# Altium footprint library Tracker_v1_1_pcb.PcbLib: 32 footprints (part 2 of 2)
Each footprint in its own frame and in the unit in brackets; x right, y up, seen from the top. Pads: shape width x height; smd on the part's side, far side on the other; paste and mask are expansions set on the pad; w line width, h text height; cw(c..) or ccw(c..) is an arc to the next point about the centre after c.
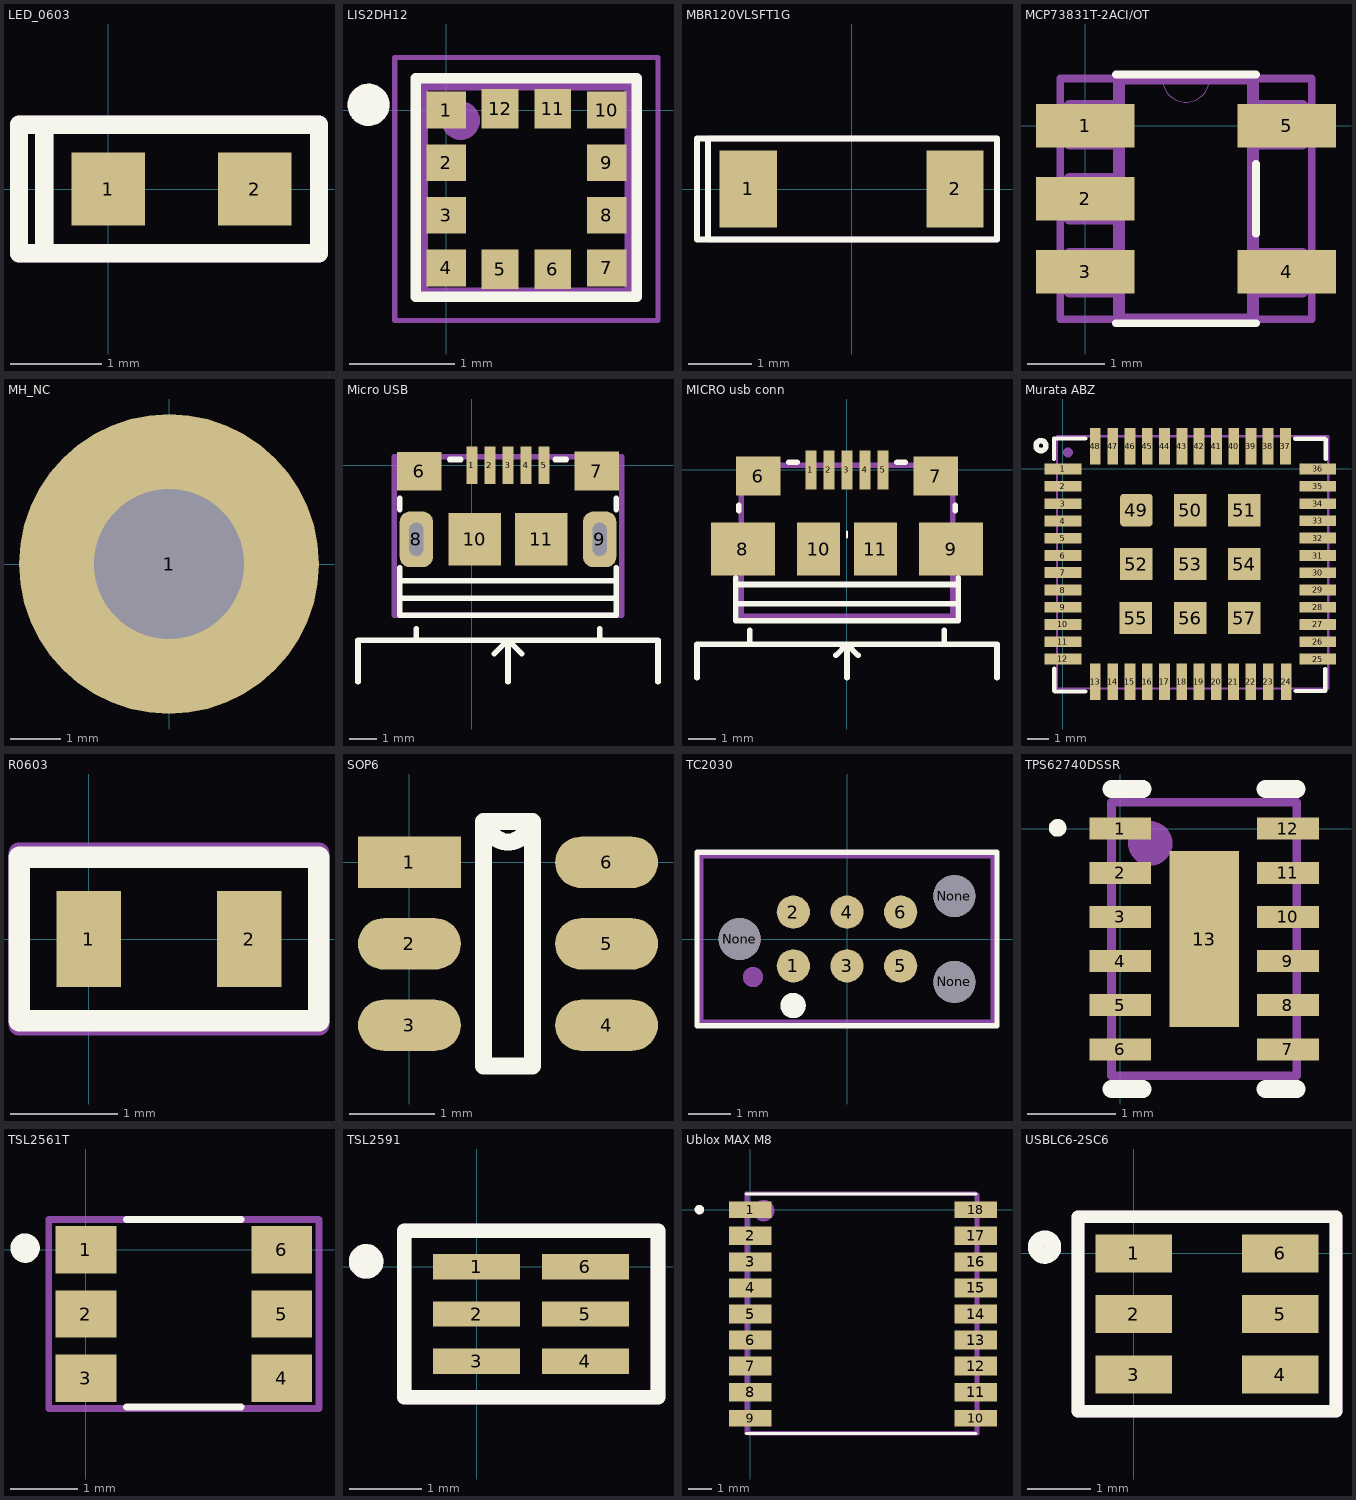
[diagram p1: the footprints below, top view; thin cyan lines are the x and y axes]

## LED_0603 [mm]
pads (2):
  rect 0.8x0.8 smd: 1(0,0) 2(1.6,0)
Top Overlay:
  lines w0.2: -0.7,-0.7 -0.975,-0.7 -0.975,0.7 -0.7,0.7 ; -0.7,-0.7 -0.7,0.7 ; -0.7,-0.7 2.3,-0.7 2.3,0.7 -0.7,0.7
Mechanical 29:
  lines w0.2: -0.7,-0.7 -0.7,0.7 ; -0.975,-0.7 -0.975,0.7 2.3,0.7 2.3,-0.7 -0.975,-0.7
  text "'.Designator'" at -0.4,-0.1 h0.6
3D body "User Library-LED SMD 0603 super red.step": height 0.6, standoff -0.05, extent 0,-0.4 1.7,0.4
3D body: height 0.65, standoff 0, extent 0.8,0.2 0.8,0.2
3D body: height 0.61, standoff 0, extent 0.451,-0.2 1.251,0.2

## LIS2DH12 [mm]
pads (12):
  rect 0.375x0.35 smd: 1(0,0) 2(0,-0.5) 3(0,-1) 4(0,-1.5) 7(1.525,-1.5) 8(1.525,-1) 9(1.525,-0.5) 10(1.525,0)
  rect 0.35x0.375 smd: 5(0.513,-1.513) 6(1.012,-1.513) 11(1.012,0.012) 12(0.513,0.012)
Top Overlay:
  circle w0.2: c-0.737,0.05 r0.1
  lines w0.1: -0.288,-1.775 1.813,-1.775 1.813,0.3 -0.288,0.3 -0.288,-1.775
Mechanical 4:
  circle w0.2: c-0.737,0.05 r0.1
  circle w0.2: c-0.737,0.05 r0.1
  lines w0.127: -0.238,-1.75 1.763,-1.75 ; -0.238,-1.75 -0.238,0.25 ; -0.238,-1.75 1.763,-1.75 ; -0.238,-1.75 -0.238,0.25 ; -0.238,0.25 1.763,0.25 ; -0.238,0.25 1.763,0.25 ; 1.763,-1.75 1.763,0.25 ; 1.763,-1.75 1.763,0.25
Mechanical 16:
  lines w0.05: -0.487,-2 2.013,-2 2.013,0.5 -0.487,0.5 -0.487,-2
Mechanical 29:
  circle w0.254: c0.138,-0.1 r0.056
  lines w0.1: -0.253,-1.766 1.746,-1.766 1.746,0.234 -0.253,0.234 -0.253,-1.766
  text "'.Designator'" at -0.162,-1.05 h0.6
3D body "User Library-LIS2DW12.STEP": height 0.63, standoff -0.08, extent -0.253,-1.766 1.746,0.234

## MBR120VLSFT1G [mm]
pads (2):
  rect 0.91x1.22 smd: 1(-1.635,0) 2(1.635,0)
Top Overlay:
  lines w0.1: -2.25,0.8 -2.45,0.8 -2.45,-0.8 -2.275,-0.8 ; -2.275,-0.8 2.3,-0.8 2.3,0.8 -2.275,0.8 -2.275,-0.8
Mechanical 29:
  circle w0.254: c-1.65,0 r0.125
  lines w0.1: -2.275,-0.8 2.3,-0.8 2.3,0.8 -2.275,0.8 -2.275,-0.8
  text "'.Designator'" at -1.075,-0.225 h0.6
3D body "User Library-SOD323.step": height 0.9, standoff -0.09, extent -1.25,-0.65 1.25,0.6
3D body: height 1, standoff 0, extent -1.35,-0.825 1.35,0.825

## MCP73831T-2ACI/OT [mil]
pads (5):
  rect 50x22 smd: 1(0,0) 2(0,-37) 3(0,-74) 4(102,-74) 5(102,0)
Top Overlay:
  circle w10: c0,0 r4.4
  lines w3.94: 15.57,-99.99 86.43,-99.99 ; 15.57,25.99 86.43,25.99 ; 86.43,-54.72 86.43,-19.28
Mechanical 4:
  lines w0: 39,24 ccw(c51,24) 63,24 cw(c51,24) 39,24
  lines w6: -8,-84 -8,-65 ; -8,-84 17,-84 ; -8,-84 -8,-65 ; -8,-84 17,-84 ; -8,-65 17,-65 ; -8,-65 17,-65 ; -8,-47 -8,-27 ; -8,-47 17,-47 ; -8,-47 -8,-27 ; -8,-47 17,-47 ; -8,-27 17,-27 ; -8,-27 17,-27 ; -8,-9 -8,10 ; -8,-9 17,-9 ; -8,-9 -8,10 ; -8,-9 17,-9 ; -8,10 17,10 ; -8,10 17,10 ; 17,-98 85,-98 ; 17,-98 17,-84 ; 17,-98 85,-98 ; 17,-98 17,-84 ; 17,-84 17,-65 ; 17,-84 17,-65 ; 17,-65 17,-47 ; 17,-65 17,-47 ; 17,-47 17,-27 ; 17,-47 17,-27 ; 17,-27 17,-9 ; 17,-27 17,-9 ; 17,-9 17,10 ; 17,-9 17,10 ; 17,10 17,24 ; 17,10 17,24 ; 17,24 39,24 ; 17,24 39,24 ; 39,24 63,24 ; 39,24 63,24 ; 63,24 85,24 ; 63,24 85,24 ; 85,-98 85,-84 ; 85,-98 85,-84 ; 85,-84 85,-65 ; 85,-84 110,-84 ; 85,-84 85,-65 ; 85,-84 110,-84 ; 85,-65 85,-9 ; 85,-65 110,-65 ; 85,-65 85,-9 ; 85,-65 110,-65 ; 85,-9 85,10 ; 85,-9 110,-9 ; 85,-9 85,10 ; 85,-9 110,-9 ; 85,10 85,24 ; 85,10 110,10 ; 85,10 85,24 ; 85,10 110,10 ; 110,-84 110,-65 ; 110,-84 110,-65 ; 110,-9 110,10 ; 110,-9 110,10
Mechanical 29:
  circle w10: c0,0 r2.2
  lines w3.94: -12.7,-98.02 -12.7,24.02 114.7,24.02 114.7,-98.02 -12.7,-98.02
3D body "PZ_MCP73831.stp": height 54, standoff -3.09, extent -12.7,-98.02 114.7,24.02

## MH_NC [mm]
pads (1):
  round 6 hole 3 unplated: 1(0,0)

## Micro USB [mm]
pads (11):
  rect 0.4x1.35 smd mask+0.05: 1(0,0) 2(0.65,0) 3(1.3,0) 4(1.95,0) 5(2.6,0)
  rect 1.6x1.4 smd: 6(-1.9,-0.225) 7(4.5,-0.22)
  rrect60% 1.2x2 hole 0.5 slot 1.2 at 90 deg mask+0.05: 8(-2,-2.675) 9(4.6,-2.675)
  rect 1.9x1.9 smd: 10(0.1,-2.675) 11(2.5,-2.675)
Top Overlay:
  lines w0.2: -4.1,-7.8 -4.1,-6.3 6.7,-6.3 6.7,-7.8 ; -2.6,-4.8 5.2,-4.8 ; -2.6,-4.166 5.2,-4.166 ; -2.6,-3.7 -2.6,-5.4 5.2,-5.4 5.2,-3.7 ; -2.6,-1.6 -2.6,-1.2 ; -2,-6.3 -2,-5.9 ; -0.8,0.2 -0.4,0.2 ; 0.8,-6.8 1.3,-6.3 ; 1.3,-7.8 1.3,-6.3 ; 1.3,-6.4 1.3,-6.3 ; 1.3,-6.35 1.35,-6.35 1.8,-6.8 ; 3,0.2 3.4,0.2 ; 4.6,-6.3 4.6,-5.9 ; 5.2,-1.6 5.2,-1.2
Mechanical 29:
  lines w0.2: -2.8,-5.4 5.4,-5.4 5.4,0.3 -2.8,0.3 -2.8,-5.4
  text "'.Designator'" at -0.5,-1.9 h0.8
3D body "User Library-3067-47340001R-Rev_01.STEP": height 2.61, standoff -0.33, extent -5.594,-4.591 2.606,1.339
3D body "10118193-0001lfc.stp": height 2.88, standoff -0.72, extent -2.629,-5.46 5.228,0.2

## MICRO usb conn [mm]
pads (11):
  rect 0.4x1.4 smd mask+0.05: 1(-1.3,0) 2(-0.65,0) 3(0,0) 4(0.65,0) 5(1.3,0)
  rect 1.6x1.4 smd: 6(-3.2,-0.225) 7(3.2,-0.225)
  rect 2.3x1.9 smd: 8(-3.75,-2.85) 9(3.75,-2.85)
  rect 1.55x1.9 smd paste-10: 10(-1.025,-2.85) 11(1.025,-2.85)
Top Overlay:
  lines w0.08: 0,-2.425 0,-2.225
  lines w0.2: -5.4,-7.475 -5.4,-6.275 5.4,-6.275 5.4,-7.475 ; -4,-4.825 4,-4.825 ; -4,-4.125 4,-4.125 ; -4,-3.875 -4,-5.425 4,-5.425 4,-3.875 ; -3.9,-1.475 -3.9,-1.275 ; -3.5,-6.275 -3.5,-5.775 ; -2.1,0.275 -1.8,0.275 ; -0.4,-6.675 0,-6.275 ; 0,-7.475 0,-6.275 ; 0.4,-6.675 0,-6.275 ; 1.8,0.275 2.1,0.275 ; 3.5,-6.275 3.5,-5.775 ; 3.9,-1.475 3.9,-1.275
Mechanical 29:
  lines w0.2: -3.8,-5.275 3.8,-5.275 3.8,0.175 -3.8,0.175 -3.8,-5.275
  text ".Designator" at -2,-3.375 h1.52
3D body "USB_MICRO_SMD.step": height 2.77, standoff -0.26, extent -4.039,-5.255 4.04,0.309

## Murata ABZ [mm]
pads (57):
  rect 1.7x0.5 smd paste-5: 1(0,0) 2(0,-0.8) 3(0,-1.61) 4(0,-2.41) 5(0,-3.21) 6(0,-4.01) 7(0,-4.8) 8(0,-5.61) 9(0,-6.41) 10(0,-7.2) 11(0,-8.01) 12(0,-8.8) 25(11.802,-8.805) 26(11.802,-8.004) 27(11.802,-7.202) 28(11.802,-6.405) 29(11.802,-5.605) 30(11.802,-4.805) 31(11.8,-4.01) 32(11.8,-3.2) 33(11.8,-2.4) 34(11.8,-1.61) 35(11.8,-0.8) 36(11.8,0)
  rect 0.5x1.7 smd paste-5: 13(1.5,-9.855) 14(2.302,-9.855) 15(3.102,-9.855) 16(3.902,-9.855) 17(4.702,-9.855) 18(5.502,-9.855) 19(6.302,-9.855) 20(7.102,-9.854) 21(7.902,-9.854) 22(8.702,-9.855) 23(9.509,-9.855) 24(10.35,-9.855) 37(10.31,1.05) 38(9.5,1.05) 39(8.71,1.05) 40(7.91,1.05) 41(7.11,1.05) 42(6.31,1.05) 43(5.51,1.05) 44(4.71,1.05) 45(3.91,1.05) 46(3.11,1.05) 47(2.31,1.05) 48(1.5,1.05)
  rrect20% 1.5x1.5 smd: 49(3.402,-1.905)
  rect 1.5x1.5 smd: 50(5.902,-1.905) 51(8.402,-1.905) 52(3.402,-4.405) 53(5.902,-4.405) 54(8.402,-4.405) 55(3.377,-6.905) 56(5.902,-6.905) 57(8.402,-6.905)
Top Overlay:
  circle w0.254: c-1.02,1.08 r0.23
  lines w0.2: -0.42,0.46 -0.42,1.4 -0.41,1.41 1.03,1.41 ; -0.41,-9.26 -0.41,-10.27 -0.37,-10.31 1.03,-10.31 ; 10.77,1.4 12.14,1.4 12.17,1.37 12.17,0.46 ; 10.79,-10.29 12.14,-10.29 12.16,-10.27 12.16,-9.27
Top Paste:
  region: 10.55,0.21 10.55,1.16 10.06,1.16 10.06,0.21
  region: 9.74,0.21 9.74,1.16 9.25,1.16 9.25,0.21
  region: 8.94,0.21 8.94,1.16 8.45,1.16 8.45,0.21
  region: 8.14,0.21 8.14,1.16 7.65,1.16 7.65,0.21
  region: 7.34,0.21 7.34,1.16 6.85,1.16 6.85,0.21
  region: 6.54,0.21 6.54,1.16 6.05,1.16 6.05,0.21
  region: 5.74,0.21 5.74,1.16 5.25,1.16 5.25,0.21
  region: 4.95,0.21 4.95,1.16 4.46,1.16 4.46,0.21
  region: 4.15,0.21 4.15,1.16 3.66,1.16 3.66,0.21
  region: 3.35,0.21 3.35,1.16 2.86,1.16 2.86,0.21
  region: 2.55,0.21 2.55,1.16 2.06,1.16 2.06,0.21
  region: 1.74,0.2 1.74,1.15 1.25,1.15 1.25,0.2
  rectangle: 10.95,-9.06 11.91,-8.56
  rectangle: 10.95,-8.26 11.91,-7.76
  rectangle: 10.95,-7.46 11.91,-6.96
  rectangle: 10.95,-6.66 11.91,-6.16
  rectangle: 10.95,-5.86 11.91,-5.36
  rectangle: 10.95,-5.06 11.91,-4.56
  rectangle: 10.95,-4.26 11.91,-3.76
  rectangle: 10.95,-3.46 11.91,-2.96
  rectangle: 10.95,-2.66 11.91,-2.16
  rectangle: 10.95,-1.86 11.91,-1.36
  rectangle: 10.95,-1.06 11.91,-0.56
  rectangle: 10.95,-0.26 11.91,0.24
  region: 10.59,-9.96 10.59,-9.01 10.1,-9.01 10.1,-9.96
  region: 9.75,-9.96 9.75,-9.01 9.26,-9.01 9.26,-9.96
  region: 8.94,-9.96 8.94,-9.01 8.45,-9.01 8.45,-9.96
  region: 8.14,-9.96 8.14,-9.01 7.65,-9.01 7.65,-9.96
  region: 7.34,-9.96 7.34,-9.01 6.85,-9.01 6.85,-9.96
  region: 6.54,-9.96 6.54,-9.01 6.05,-9.01 6.05,-9.96
  region: 5.74,-9.96 5.74,-9.01 5.25,-9.01 5.25,-9.96
  region: 4.94,-9.96 4.94,-9.01 4.45,-9.01 4.45,-9.96
  region: 4.15,-9.96 4.15,-9.01 3.66,-9.01 3.66,-9.96
  region: 3.35,-9.96 3.35,-9.01 2.86,-9.01 2.86,-9.96
  region: 2.54,-9.96 2.54,-9.01 2.05,-9.01 2.05,-9.96
  region: 1.74,-9.96 1.74,-9.01 1.25,-9.01 1.25,-9.96
  rectangle: -0.11,-9.05 0.84,-8.56
  rectangle: -0.11,-8.25 0.84,-7.76
  rectangle: -0.11,-7.45 0.84,-6.96
  rectangle: -0.11,-6.65 0.84,-6.16
  rectangle: -0.11,-5.85 0.84,-5.36
  rectangle: -0.11,-5.05 0.84,-4.56
  rectangle: -0.11,-4.25 0.84,-3.76
  rectangle: -0.11,-3.45 0.84,-2.96
  rectangle: -0.11,-2.65 0.84,-2.16
  rectangle: -0.11,-1.85 0.84,-1.36
  rectangle: -0.11,-1.04 0.84,-0.55
  rectangle: -0.11,-0.25 0.85,0.25
Mechanical 29:
  circle w0.254: c0.231,0.765 r0.1
  lines w0.1: -0.283,-10.165 12.29,-10.165 12.29,1.519 -0.283,1.519 -0.283,-10.165
  text "'.Designator'" at 2.856,-4.76 h1
3D body "CMWX1ZZABZ.STEP": height 1.76, standoff 0, extent -0.348,-10.205 12.152,1.395
3D body "User Library-CMWX1ZZABZ.STEP": height 1.76, standoff 0, extent -0.283,-10.165 12.217,1.435

## R0603 [mm]
pads (2):
  rect 0.6x0.9 smd: 1(0,0) 2(1.5,0)
Top Overlay:
  lines w0.2: -0.647,-0.762 2.147,-0.762 2.147,0.762 -0.647,0.762 -0.647,-0.762
Mechanical 29:
  lines w0.2: -0.65,-0.8 2.15,-0.8 2.15,0.8 -0.65,0.8 -0.65,-0.8
  text "'.Designator'" at -0.05,-0.432 h0.6
3D body "R0603.step": height 0.7, standoff -0.1, extent -0.05,-0.432 1.55,0.408

## SOP6 [mm]
pads (6):
  rect 1.2x0.6 smd: 1(0,0)
  oval 1.2x0.6 smd: 2(0,-0.95) 3(0,-1.9) 4(2.3,-1.9) 5(2.3,-0.95) 6(2.3,0)
Top Overlay:
  lines w0.2: 0.865,-2.375 1.435,-2.375 1.435,0.475 0.913,0.475 ccw(c1.15,0.475) 1.388,0.475 0.865,0.475 0.865,-2.375

## TC2030 [mil]
pads (9):
  round 30.98 smd: 1(-50,-25) 2(-50,25) 3(0,-25) 4(0,25) 5(50,-25) 6(50,25)
  round 39.02 hole 39.02 unplated: None(-100,0) None(100,-40) None(100,40)
Top Overlay:
  circle w11.81: c-50.2,-62.01 r5.91
  lines w5: -139.76,-80.71 139.76,-80.71 139.76,80.71 -139.76,80.71 -139.76,-80.71
Mechanical 29:
  circle w10: c-87.6,-35.43 r4.4
  lines w7.87: -137.6,-78.74 -137.6,78.74 137.8,78.74 137.8,-78.74 -137.6,-78.74
  text "SDIO" at -44.84,56.02 h15.75
  text "SCLK" at 10.16,56.02 h15.75
  text "Boot" at 55.16,56.02 h15.75
  text "Vcc" at -44.84,-103.98 h19.68
  text "RST" at 10.16,-103.98 h19.68
  text "GND" at 60.16,-103.98 h19.68

## TPS62740DSSR [mm]
pads (13):
  rect 0.7x0.25 smd: 1(0,0) 2(0,-0.5) 3(0,-1) 4(0,-1.5) 5(0,-2) 6(0,-2.5) 7(1.9,-2.5) 8(1.9,-2) 9(1.9,-1.5) 10(1.9,-1) 11(1.9,-0.5) 12(1.9,0)
  rect 0.79x2 smd: 13(0.95,-1.25)
Top Overlay:
  circle w0.1: c-0.711,0.009 r0.05
  lines w0.2: -0.1,-2.95 0.255,-2.95 ; -0.1,0.45 0.255,0.45 ; 1.645,-2.95 2,-2.95 ; 1.645,0.45 2,0.45
Mechanical 29:
  circle w0.254: c0.339,-0.166 r0.125
  lines w0.1: -0.1,-2.8 -0.1,0.3 2,0.3 2,-2.8 -0.1,-2.8
  text "'.Designator'" at 0.061,-2.012 h0.8
3D body: height 0.8, standoff -0.02, extent -0.18,-2.8 2.08,0.3

## TSL2561T [mm]
pads (6):
  rect 0.9x0.7 smd mask+0.07: 1(0,0) 2(0,-0.95) 3(0,-1.9) 4(2.9,-1.9) 5(2.9,-0.95) 6(2.9,0)
Top Overlay:
  circle w0.254: c-0.9,0.025 r0.09
  lines w0.1: 0.6,-2.325 2.3,-2.325 ; 0.6,0.45 2.3,0.45
Mechanical 29:
  circle w0.254: c0,0 r0.106
  lines w0.1: -0.55,-2.35 -0.55,0.45 3.45,0.45 3.45,-2.35 -0.55,-2.35
  text "'.Designator'" at 0.375,-1.3 h0.6
3D body: height 1.33, standoff 0, extent -0.45,-2.25 3.35,0.35
3D body: height 1.34, standoff 0, extent 0.925,-1.725 2.175,0.075
3D body: height 1.35, standoff 0, extent 1.55,-1.725 1.8,0.075

## TSL2591 [mm]
pads (6):
  rect 1.2x0.35 smd: 1(0,0) 2(0,-0.65) 3(0,-1.3) 4(1.5,-1.3) 5(1.5,-0.65) 6(1.5,0)
Top Overlay:
  lines w0.2: -1,-1.8 2.5,-1.8 2.5,0.5 -1,0.5 -1,-1.8
  lines w0.254: -1.438,0.145 ccw(c-1.525,0.075) -1.425,0.125
Mechanical 13:
  circle w0.254: c-1.525,0.075 r0.112
  lines w0.2: -1,-1.8 2.5,-1.8 2.5,0.5 -1,0.5 -1,-1.8
3D body: height 0.7, standoff 0, extent -0.225,-1.875 1.775,0.525

## Ublox MAX M8 [mm]
pads (18):
  rect 1.8x0.7 smd: 1(0,0) 9(0,-8.8) 10(9.5,-8.8) 18(9.5,0)
  rect 1.8x0.8 smd: 2(0,-1.1) 3(0,-2.2) 4(0,-3.3) 5(0,-4.4) 6(0,-5.5) 7(0,-6.6) 8(0,-7.7) 11(9.5,-7.7) 12(9.5,-6.6) 13(9.5,-5.5) 14(9.5,-4.4) 15(9.5,-3.3) 16(9.5,-2.2) 17(9.5,-1.1)
Top Overlay:
  circle w0.2: c-2.15,0 r0.1
  lines w0.127: -0.187,-9.443 9.513,-9.443 ; -0.187,0.657 9.513,0.657
Top Paste:
  region: 10.3,-9.15 9.6,-9.15 9.6,-9.05 8.7,-9.05 8.7,-8.55 9.6,-8.55 9.6,-8.45 10.3,-8.45
  region: 10.3,-8.1 9.6,-8.1 9.6,-8 8.7,-8 8.7,-7.4 9.6,-7.4 9.6,-7.3 10.3,-7.3
  region: 10.3,-7 9.6,-7 9.6,-6.9 8.7,-6.9 8.7,-6.3 9.6,-6.3 9.6,-6.2 10.3,-6.2
  region: 10.3,-5.9 9.6,-5.9 9.6,-5.8 8.7,-5.8 8.7,-5.2 9.6,-5.2 9.6,-5.1 10.3,-5.1
  region: 10.3,-4.8 9.6,-4.8 9.6,-4.7 8.7,-4.7 8.7,-4.1 9.6,-4.1 9.6,-4 10.3,-4
  region: 10.3,-3.7 9.6,-3.7 9.6,-3.6 8.7,-3.6 8.7,-3 9.6,-3 9.6,-2.9 10.3,-2.9
  region: 10.3,-2.6 9.6,-2.6 9.6,-2.5 8.7,-2.5 8.7,-1.9 9.6,-1.9 9.6,-1.8 10.3,-1.8
  region: 10.3,-1.5 9.6,-1.5 9.6,-1.4 8.7,-1.4 8.7,-0.8 9.6,-0.8 9.6,-0.7 10.3,-0.7
  region: 10.3,-0.35 9.6,-0.35 9.6,-0.25 8.7,-0.25 8.7,0.25 9.6,0.25 9.6,0.35 10.3,0.35
  region: -0.9,0.35 -0.1,0.35 -0.1,0.25 0.8,0.25 0.8,-0.25 -0.1,-0.25 -0.1,-0.35 -0.9,-0.35
  region: -0.9,-0.7 -0.1,-0.7 -0.1,-0.8 0.8,-0.8 0.8,-1.4 -0.1,-1.4 -0.1,-1.5 -0.9,-1.5
  region: -0.9,-1.8 -0.1,-1.8 -0.1,-1.9 0.8,-1.9 0.8,-2.5 -0.1,-2.5 -0.1,-2.6 -0.9,-2.6
  region: -0.9,-2.9 -0.1,-2.9 -0.1,-3 0.8,-3 0.8,-3.6 -0.1,-3.6 -0.1,-3.7 -0.9,-3.7
  region: -0.9,-4 -0.1,-4 -0.1,-4.1 0.8,-4.1 0.8,-4.7 -0.1,-4.7 -0.1,-4.8 -0.9,-4.8
  region: -0.9,-5.1 -0.1,-5.1 -0.1,-5.2 0.8,-5.2 0.8,-5.8 -0.1,-5.8 -0.1,-5.9 -0.9,-5.9
  region: -0.9,-6.2 -0.1,-6.2 -0.1,-6.3 0.8,-6.3 0.8,-6.9 -0.1,-6.9 -0.1,-7 -0.9,-7
  region: -0.9,-7.3 -0.1,-7.3 -0.1,-7.4 0.8,-7.4 0.8,-8 -0.1,-8 -0.1,-8.1 -0.9,-8.1
  region: -0.9,-8.45 -0.1,-8.45 -0.1,-8.55 0.8,-8.55 0.8,-9.05 -0.1,-9.05 -0.1,-9.15 -0.9,-9.15
Top Solder:
  region: 10.4,-0.35 8.6,-0.35 8.6,0.35 10.4,0.35
  region: 10.4,-1.5 8.6,-1.5 8.6,-0.7 10.4,-0.7
  region: 10.4,-2.6 8.6,-2.6 8.6,-1.8 10.4,-1.8
  region: 10.4,-3.7 8.6,-3.7 8.6,-2.9 10.4,-2.9
  region: 10.4,-4.8 8.6,-4.8 8.6,-4 10.4,-4
  region: 10.4,-5.9 8.6,-5.9 8.6,-5.1 10.4,-5.1
  region: 10.4,-7 8.6,-7 8.6,-6.2 10.4,-6.2
  region: 10.4,-8.1 8.6,-8.1 8.6,-7.3 10.4,-7.3
  region: 10.4,-9.15 8.6,-9.15 8.6,-8.45 10.4,-8.45
  region: -0.9,-8.45 0.9,-8.45 0.9,-9.15 -0.9,-9.15
  region: -0.9,-7.3 0.9,-7.3 0.9,-8.1 -0.9,-8.1
  region: -0.9,-6.2 0.9,-6.2 0.9,-7 -0.9,-7
  region: -0.9,-5.1 0.9,-5.1 0.9,-5.9 -0.9,-5.9
  region: -0.9,-4 0.9,-4 0.9,-4.8 -0.9,-4.8
  region: -0.9,-2.9 0.9,-2.9 0.9,-3.7 -0.9,-3.7
  region: -0.9,-1.8 0.9,-1.8 0.9,-2.6 -0.9,-2.6
  region: -0.9,-0.7 0.9,-0.7 0.9,-1.5 -0.9,-1.5
  region: -0.9,0.35 0.9,0.35 0.9,-0.35 -0.9,-0.35
Mechanical 4:
  circle w0.2: c-2.15,0 r0.1
  circle w0.2: c-2.15,0 r0.1
  lines w0.127: -0.1,-9.45 9.6,-9.45 ; -0.1,-9.45 -0.1,0.65 ; -0.1,-9.45 9.6,-9.45 ; -0.1,-9.45 -0.1,0.65 ; -0.1,0.65 9.6,0.65 ; -0.1,0.65 9.6,0.65 ; 9.6,-9.45 9.6,0.65 ; 9.6,-9.45 9.6,0.65
Mechanical 29:
  circle w0.5: c0.563,-0.043 r0.2
  lines w0.1: -0.202,-9.393 9.5,-9.393 9.5,0.707 -0.202,0.707 -0.202,-9.393
  text "'.Designator'" at 2.288,-4.893 h1
3D body "User Library-MAX-M8 u-blox M8 Concurrent GNSS Module.STEP": height 2.45, standoff -0.05, extent -0.213,-9.443 9.489,0.657

## USBLC6-2SC6 [mm]
pads (6):
  rect 1.2x0.6 smd: 1(0,0) 2(0,-0.95) 3(0,-1.9) 4(2.3,-1.9) 5(2.3,-0.95) 6(2.3,0)
Top Overlay:
  circle w0.254: c-1.4,0.1 r0.135
  lines w0.2: -0.875,-2.475 3.175,-2.475 3.175,0.575 -0.875,0.575 -0.875,-2.475
Mechanical 29:
  circle w0.254: c-1.4,0.1 r0.125
  lines w0.2: -0.875,-2.475 3.175,-2.475 3.175,0.575 -0.875,0.575 -0.875,-2.475
  text "'.Designator'" at -0.275,-1.75 h1
3D body "IC_STMicroelectronics_USBLC6-2SC6_eec.STEP": height 1.39, standoff -0.01, extent -0.36,-2.473 2.71,0.577